# Altium footprint library Components.PcbLib: 260 footprints (part 2 of 17)
Each footprint in its own frame and in the unit in brackets; x right, y up, seen from the top. Pads: shape width x height; smd on the part's side, far side on the other; paste and mask are expansions set on the pad; w line width, h text height; cw(c..) or ccw(c..) is an arc to the next point about the centre after c.
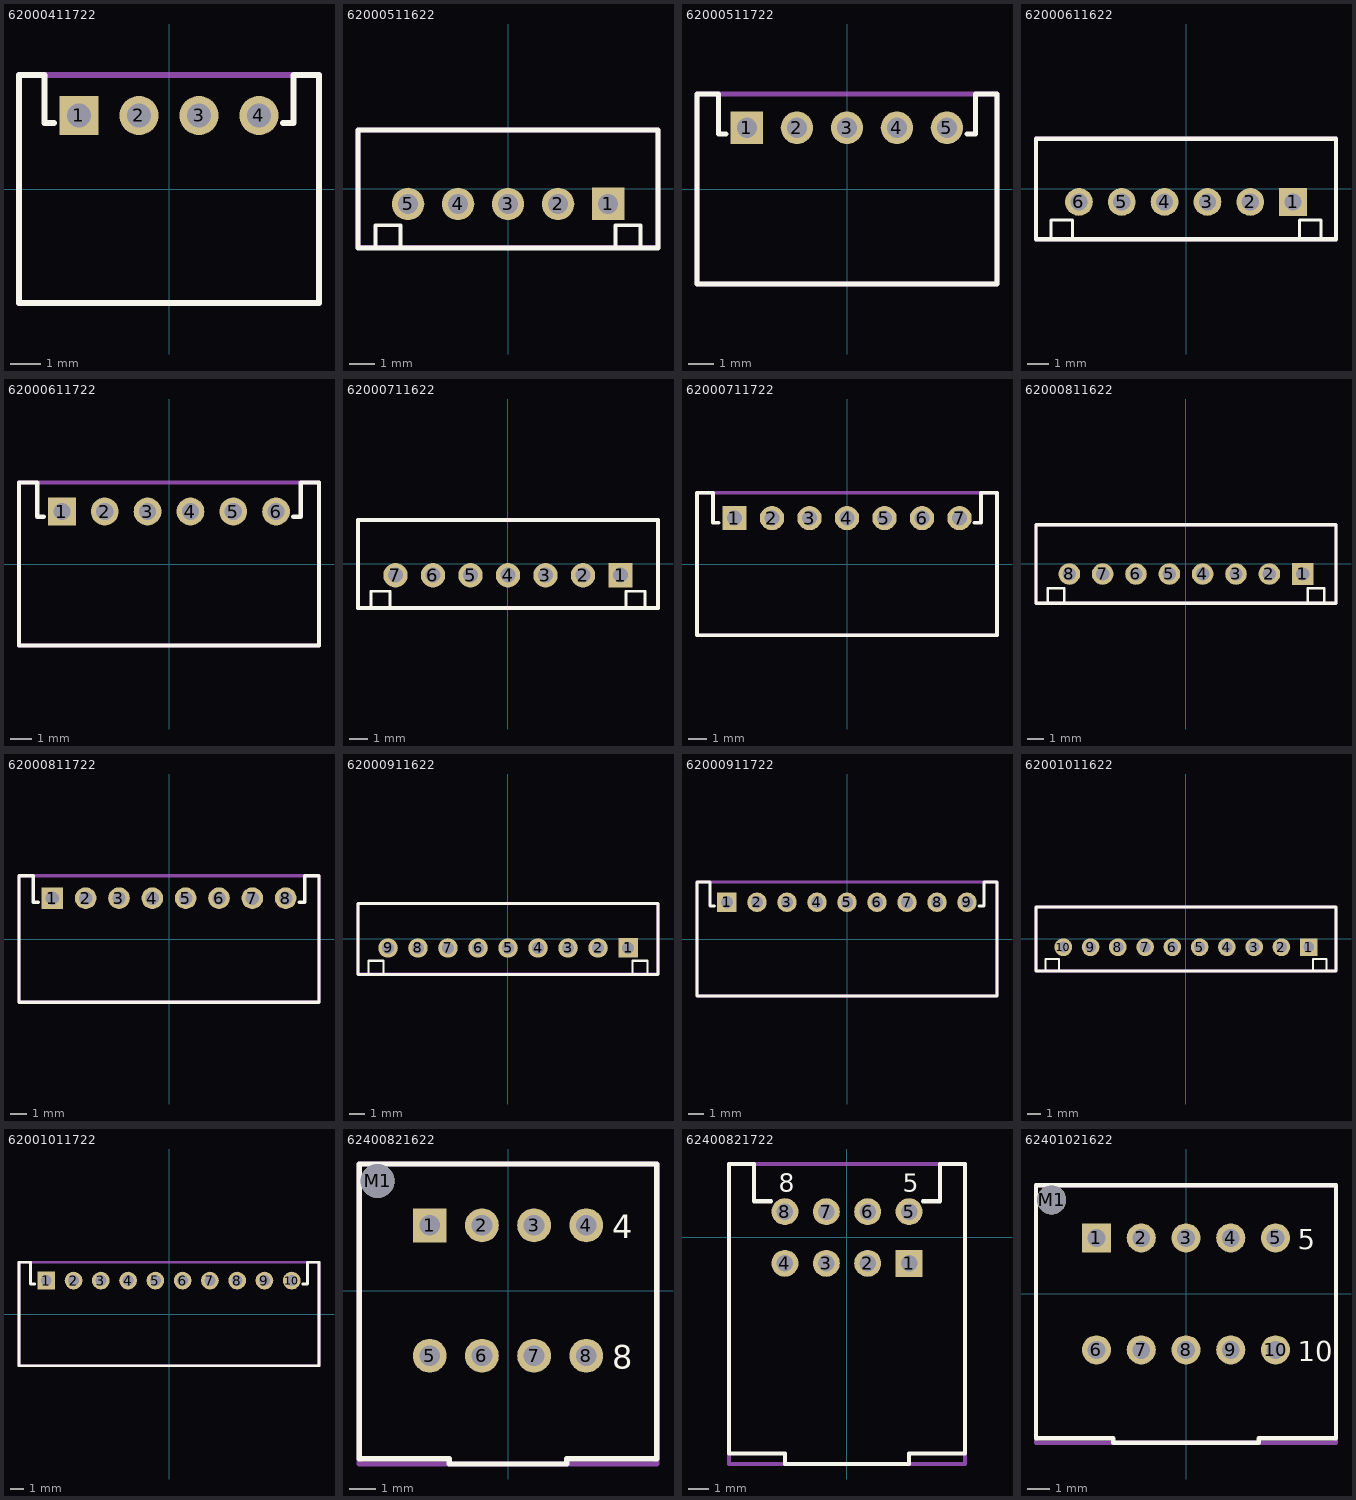
[diagram p1: the footprints below, top view; thin cyan lines are the x and y axes]

## 62000411722 [mm] "2.00mm Male Horizontal Shrouded Header, 4p"
height 4.5
pads (4):
  rect 1.3x1.3 hole 0.8: 1(-3,2.45)
  round 1.3 hole 0.8: 2(-1,2.45) 3(1,2.45) 4(3,2.45)
Top Overlay:
  lines w0.2: -3.84,2.2 -4.15,2.2 -4.15,3.8 -5,3.8 -5,-3.8 5,-3.8 5,3.8 4.15,3.8 4.15,2.2 3.8,2.2
Mechanical 13:
  lines w0.2: -5,-3.8 5,-3.8 5,3.8 -5,3.8 -5,-3.8
3D body "62000411722.stp": height 4.85, standoff -3.24, extent -5,-3.8 5,3.8

## 62000511622 [mm] "2.00mm Male Vertical Shrouded Header, 5p"
height 6.1
pads (5):
  rect 1.3x1.3 hole 0.8: 1(4,-0.6)
  round 1.3 hole 0.8: 2(2,-0.6) 3(0,-0.6) 4(-2,-0.6) 5(-4,-0.6)
Top Overlay:
  lines w0.15: -5.3,-2.35 -5.3,-1.45 -4.3,-1.45 -4.3,-2.35 ; 4.3,-2.35 4.3,-1.45 5.3,-1.45 5.3,-2.35
  lines w0.2: -6,-2.35 -6,2.35 6,2.35 6,-2.35 -6,-2.35
Mechanical 13:
  lines w0.2: -6,-2.35 6,-2.35 6,2.35 -6,2.35 -6,-2.35
3D body "62000511622.stp": height 6.15, standoff -3.35, extent -6,-2.35 6,2.35

## 62000511722 [mm] "2.00mm Male Horizontal Shrouded Header, 5p"
height 4.5
pads (5):
  rect 1.3x1.3 hole 0.8: 1(-4,2.45)
  round 1.3 hole 0.8: 2(-2,2.45) 3(0,2.45) 4(2,2.45) 5(4,2.45)
Top Overlay:
  lines w0.2: -4.84,2.2 -5.15,2.2 -5.15,3.8 -6,3.8 -6,-3.8 6,-3.8 6,3.8 5.15,3.8 5.15,2.2 4.8,2.2
Mechanical 13:
  lines w0.2: -6,-3.8 -6,3.8 6,3.8 6,-3.8 -6,-3.8
3D body "62000511722.stp": height 4.85, standoff -3.24, extent -6,-3.8 6,3.8

## 62000611622 [mm] "2.00mm Male Vertical Shrouded Header, 6p"
height 6.1
pads (6):
  rect 1.3x1.3 hole 0.8: 1(5,-0.6)
  round 1.3 hole 0.8: 2(3,-0.6) 3(1,-0.6) 4(-1,-0.6) 5(-3,-0.6) 6(-5,-0.6)
Top Overlay:
  lines w0.15: -6.3,-2.35 -6.3,-1.45 -5.3,-1.45 -5.3,-2.35 ; 5.3,-2.35 5.3,-1.45 6.3,-1.45 6.3,-2.35
  lines w0.2: -7,-2.35 7,-2.35 7,2.35 -7,2.35 -7,-2.35
Mechanical 13:
  lines w0.2: -7,-2.35 -7,2.35 7,2.35 7,-2.35 -7,-2.35
3D body "62000611622.stp": height 6.12, standoff -3.38, extent -7,-2.35 7,2.3

## 62000611722 [mm] "2.00mm Male Horizontal Shrouded Header, 6p"
height 4.5
pads (6):
  rect 1.3x1.3 hole 0.8: 1(-5,2.45)
  round 1.3 hole 0.8: 2(-3,2.45) 3(-1,2.45) 4(1,2.45) 5(3,2.45) 6(5,2.45)
Top Overlay:
  lines w0.2: -5.84,2.2 -6.15,2.2 -6.15,3.8 -7,3.8 -7,-3.8 7,-3.8 7,3.8 6.15,3.8 6.15,2.2 5.8,2.2
Mechanical 13:
  lines w0.2: -7,-3.8 7,-3.8 7,3.8 -7,3.8 -7,-3.8
3D body "62000611722.stp": height 4.85, standoff -3.24, extent -7,-3.8 7,3.8

## 62000711622 [mm] "2.00mm Male Vertical Shrouded Header, 7p"
height 6.1
pads (7):
  rect 1.3x1.3 hole 0.8: 1(6,-0.6)
  round 1.3 hole 0.8: 2(4,-0.6) 3(2,-0.6) 4(0,-0.6) 5(-2,-0.6) 6(-4,-0.6) 7(-6,-0.6)
Top Overlay:
  lines w0.15: -7.3,-2.35 -7.3,-1.45 -6.3,-1.45 -6.3,-2.35 ; 6.3,-2.35 6.3,-1.45 7.3,-1.45 7.3,-2.35
  lines w0.2: -8,-2.35 -8,2.35 8,2.35 8,-2.35 -8,-2.35
Mechanical 13:
  lines w0.2: -8,-2.35 8,-2.35 8,2.35 -8,2.35 -8,-2.35
3D body "62000711622.stp": height 6.15, standoff -3.35, extent -8,-2.35 8,2.35

## 62000711722 [mm] "2.00mm Male Horizontal Shrouded Header, 7p"
height 4.5
pads (7):
  rect 1.3x1.3 hole 0.8: 1(-6,2.45)
  round 1.3 hole 0.8: 2(-4,2.45) 3(-2,2.45) 4(0,2.45) 5(2,2.45) 6(4,2.45) 7(6,2.45)
Top Overlay:
  lines w0.2: -6.84,2.2 -7.15,2.2 -7.15,3.8 -8,3.8 -8,-3.8 8,-3.8 8,3.8 7.15,3.8 7.15,2.2 6.8,2.2
Mechanical 13:
  lines w0.2: -8,-3.8 -8,3.8 8,3.8 8,-3.8 -8,-3.8
3D body "62000711722.stp": height 4.85, standoff -3.24, extent -8,-3.8 8,3.8

## 62000811622 [mm] "2.00mm Male Vertical Shrouded Header, 8p"
height 6.1
pads (8):
  rect 1.3x1.3 hole 0.8: 1(7,-0.6)
  round 1.3 hole 0.8: 2(5,-0.6) 3(3,-0.6) 4(1,-0.6) 5(-1,-0.6) 6(-3,-0.6) 7(-5,-0.6) 8(-7,-0.6)
Top Overlay:
  lines w0.15: -8.3,-2.35 -8.3,-1.45 -7.3,-1.45 -7.3,-2.35 ; 7.3,-2.35 7.3,-1.45 8.3,-1.45 8.3,-2.35
  lines w0.2: -9,-2.35 9,-2.35 9,2.35 -9,2.35 -9,-2.35
Mechanical 13:
  lines w0.2: -9,-2.35 -9,2.35 9,2.35 9,-2.35 -9,-2.35
3D body "62000811622.stp": height 6.15, standoff -3.35, extent -9,-2.35 9,2.35

## 62000811722 [mm] "2.00mm Male Horizontal Shrouded Header, 8p"
height 4.5
pads (8):
  rect 1.3x1.3 hole 0.8: 1(-7,2.45)
  round 1.3 hole 0.8: 2(-5,2.45) 3(-3,2.45) 4(-1,2.45) 5(1,2.45) 6(3,2.45) 7(5,2.45) 8(7,2.45)
Top Overlay:
  lines w0.2: -7.84,2.2 -8.15,2.2 -8.15,3.8 -9,3.8 -9,-3.8 9,-3.8 9,3.8 8.15,3.8 8.15,2.2 7.8,2.2
Mechanical 13:
  lines w0.2: -9,-3.8 9,-3.8 9,3.8 -9,3.8 -9,-3.8
3D body "62000811722.stp": height 4.85, standoff -3.24, extent -9,-3.8 9,3.8

## 62000911622 [mm] "2.00mm Male Vertical Shrouded Header, 9p"
height 6.1
pads (9):
  rect 1.3x1.3 hole 0.8: 1(8,-0.6)
  round 1.3 hole 0.8: 2(6,-0.6) 3(4,-0.6) 4(2,-0.6) 5(0,-0.6) 6(-2,-0.6) 7(-4,-0.6) 8(-6,-0.6) 9(-8,-0.6)
Top Overlay:
  lines w0.15: -9.3,-2.35 -9.3,-1.45 -8.3,-1.45 -8.3,-2.35 ; 8.3,-2.35 8.3,-1.45 9.3,-1.45 9.3,-2.35
  lines w0.2: -10,-2.35 -10,2.35 10,2.35 10,-2.35 -10,-2.35
Mechanical 13:
  lines w0.2: -10,-2.35 10,-2.35 10,2.35 -10,2.35 -10,-2.35
3D body "62000911622.stp": height 6.12, standoff -3.38, extent -10,-2.35 10,2.3

## 62000911722 [mm] "2.00mm Male Horizontal Shrouded Header, 9p"
height 4.5
pads (9):
  rect 1.3x1.3 hole 0.8: 1(-8,2.45)
  round 1.3 hole 0.8: 2(-6,2.45) 3(-4,2.45) 4(-2,2.45) 5(0,2.45) 6(2,2.45) 7(4,2.45) 8(6,2.45) 9(8,2.45)
Top Overlay:
  lines w0.2: -8.84,2.2 -9.15,2.2 -9.15,3.8 -10,3.8 -10,-3.8 10,-3.8 10,3.8 9.15,3.8 9.15,2.2 8.8,2.2
Mechanical 13:
  lines w0.2: -10,-3.8 -10,3.8 10,3.8 10,-3.8 -10,-3.8
3D body "62000911722.stp": height 4.85, standoff -3.24, extent -10,-3.8 10,3.8

## 62001011622 [mm] "2.00mm Male Vertical Shrouded Header, 10p"
height 6.1
pads (10):
  rect 1.3x1.3 hole 0.8: 1(9,-0.6)
  round 1.3 hole 0.8: 2(7,-0.6) 3(5,-0.6) 4(3,-0.6) 5(1,-0.6) 6(-1,-0.6) 7(-3,-0.6) 8(-5,-0.6) 9(-7,-0.6) 10(-9,-0.6)
Top Overlay:
  lines w0.15: -10.3,-2.35 -10.3,-1.45 -9.3,-1.45 -9.3,-2.35 ; 9.3,-2.35 9.3,-1.45 10.3,-1.45 10.3,-2.35
  lines w0.2: -11,-2.35 -11,2.35 11,2.35 11,-2.35 -11,-2.35
Mechanical 13:
  lines w0.2: -11,-2.35 11,-2.35 11,2.35 -11,2.35 -11,-2.35
3D body "62001011622.stp": height 6.15, standoff -3.35, extent -11,-2.35 11,2.35

## 62001011722 [mm] "2.00mm Male Horizontal Shrouded Header, 10p"
height 4.5
pads (10):
  rect 1.3x1.3 hole 0.8: 1(-9,2.45)
  round 1.3 hole 0.8: 2(-7,2.45) 3(-5,2.45) 4(-3,2.45) 5(-1,2.45) 6(1,2.45) 7(3,2.45) 8(5,2.45) 9(7,2.45) 10(9,2.45)
Top Overlay:
  lines w0.2: -9.84,2.2 -10.15,2.2 -10.15,3.8 -11,3.8 -11,-3.8 11,-3.8 11,3.8 10.15,3.8 10.15,2.2 9.8,2.2
Mechanical 13:
  lines w0.2: -11,-3.8 -11,3.8 11,3.8 11,-3.8 -11,-3.8
3D body "62001011722.stp": height 4.85, standoff -3.24, extent -11,-3.8 11,3.8

## 62400821622 [mm] "2.00mm Male Dual Row Vertical Shrouded Header with positive locking, 8p"
height 11.6
pads (9):
  rect 1.3x1.3 hole 0.8: 1(-3,2.5)
  round 1.3 hole 0.8: 2(-1,2.5) 3(1,2.5) 4(3,2.5) 5(-3,-2.5) 6(-1,-2.5) 7(1,-2.5) 8(3,-2.5)
  round 1.3 hole 1.3 unplated: M1(-5,4.2)
Top Overlay:
  lines w0.2: -5.7,-6.45 -2.25,-6.45 -2.25,-6.65 2.25,-6.65 2.25,-6.45 5.7,-6.45 5.7,4.85 -5.7,4.85 -5.7,-6.45
  text "4" at 4,2 h0.89
  text "8" at 4,-3 h0.89
Mechanical 13:
  lines w0.2: -5.7,-6.65 5.7,-6.65 5.7,4.85 -5.7,4.85 -5.7,-6.65
3D body "62400821622.stp": height 9.82, standoff -3.13, extent -5.7,-6.65 5.7,4.85

## 62400821722 [mm] "2.00mm Male Dual Row Horizontal Shrouded Header with positive locking, 8p"
height 11.7
pads (8):
  rect 1.3x1.3 hole 0.8: 1(3,-1.25)
  round 1.3 hole 0.8: 2(1,-1.25) 3(-1,-1.25) 4(-3,-1.25) 5(3,1.25) 6(1,1.25) 7(-1,1.25) 8(-3,1.25)
Top Overlay:
  lines w0.2: -3.68,1.75 -4.5,1.75 -4.5,3.55 -5.7,3.55 -5.7,-10.45 -3,-10.45 -3,-10.95 3,-10.95 3,-10.45 5.7,-10.45 5.7,3.55 4.5,3.55 4.5,1.75 3.68,1.75
  text "5" at 2.7,2.2 h0.89
  text "8" at -3.3,2.2 h0.89
Mechanical 13:
  lines w0.2: -5.7,-10.95 -5.7,3.55 5.7,3.55 5.7,-10.95 -5.7,-10.95
3D body "62400821722.stp": height 11.75, standoff -3.15, extent -5.7,-10.95 5.7,3.55

## 62401021622 [mm] "2.00mm Male Dual Row Vertical Shrouded Header with positive locking, 10p"
height 11.6
pads (11):
  rect 1.3x1.3 hole 0.8: 1(-4,2.5)
  round 1.3 hole 0.8: 2(-2,2.5) 3(0,2.5) 4(2,2.5) 5(4,2.5) 6(-4,-2.5) 7(-2,-2.5) 8(0,-2.5) 9(2,-2.5) 10(4,-2.5)
  round 1.3 hole 1.3 unplated: M1(-6,4.2)
Top Overlay:
  lines w0.2: -6.7,-6.45 -6.7,4.85 6.7,4.85 6.7,-6.45 3.25,-6.45 3.25,-6.65 -3.25,-6.65 -3.25,-6.45 -6.7,-6.45
  text "5" at 5,2 h0.89
  text "10" at 5,-3 h0.89
Mechanical 13:
  lines w0.2: -6.7,-6.65 -6.7,4.85 6.7,4.85 6.7,-6.65 -6.7,-6.65
3D body "62401021622.stp": height 9.82, standoff -3.13, extent -6.7,-6.65 6.7,4.85